# Altium footprint library SMT.PcbLib: 325 footprints (part 8 of 21)
Each footprint in its own frame and in the unit in brackets; x right, y up, seen from the top. Pads: shape width x height; smd on the part's side, far side on the other; paste and mask are expansions set on the pad; w line width, h text height; cw(c..) or ccw(c..) is an arc to the next point about the centre after c.
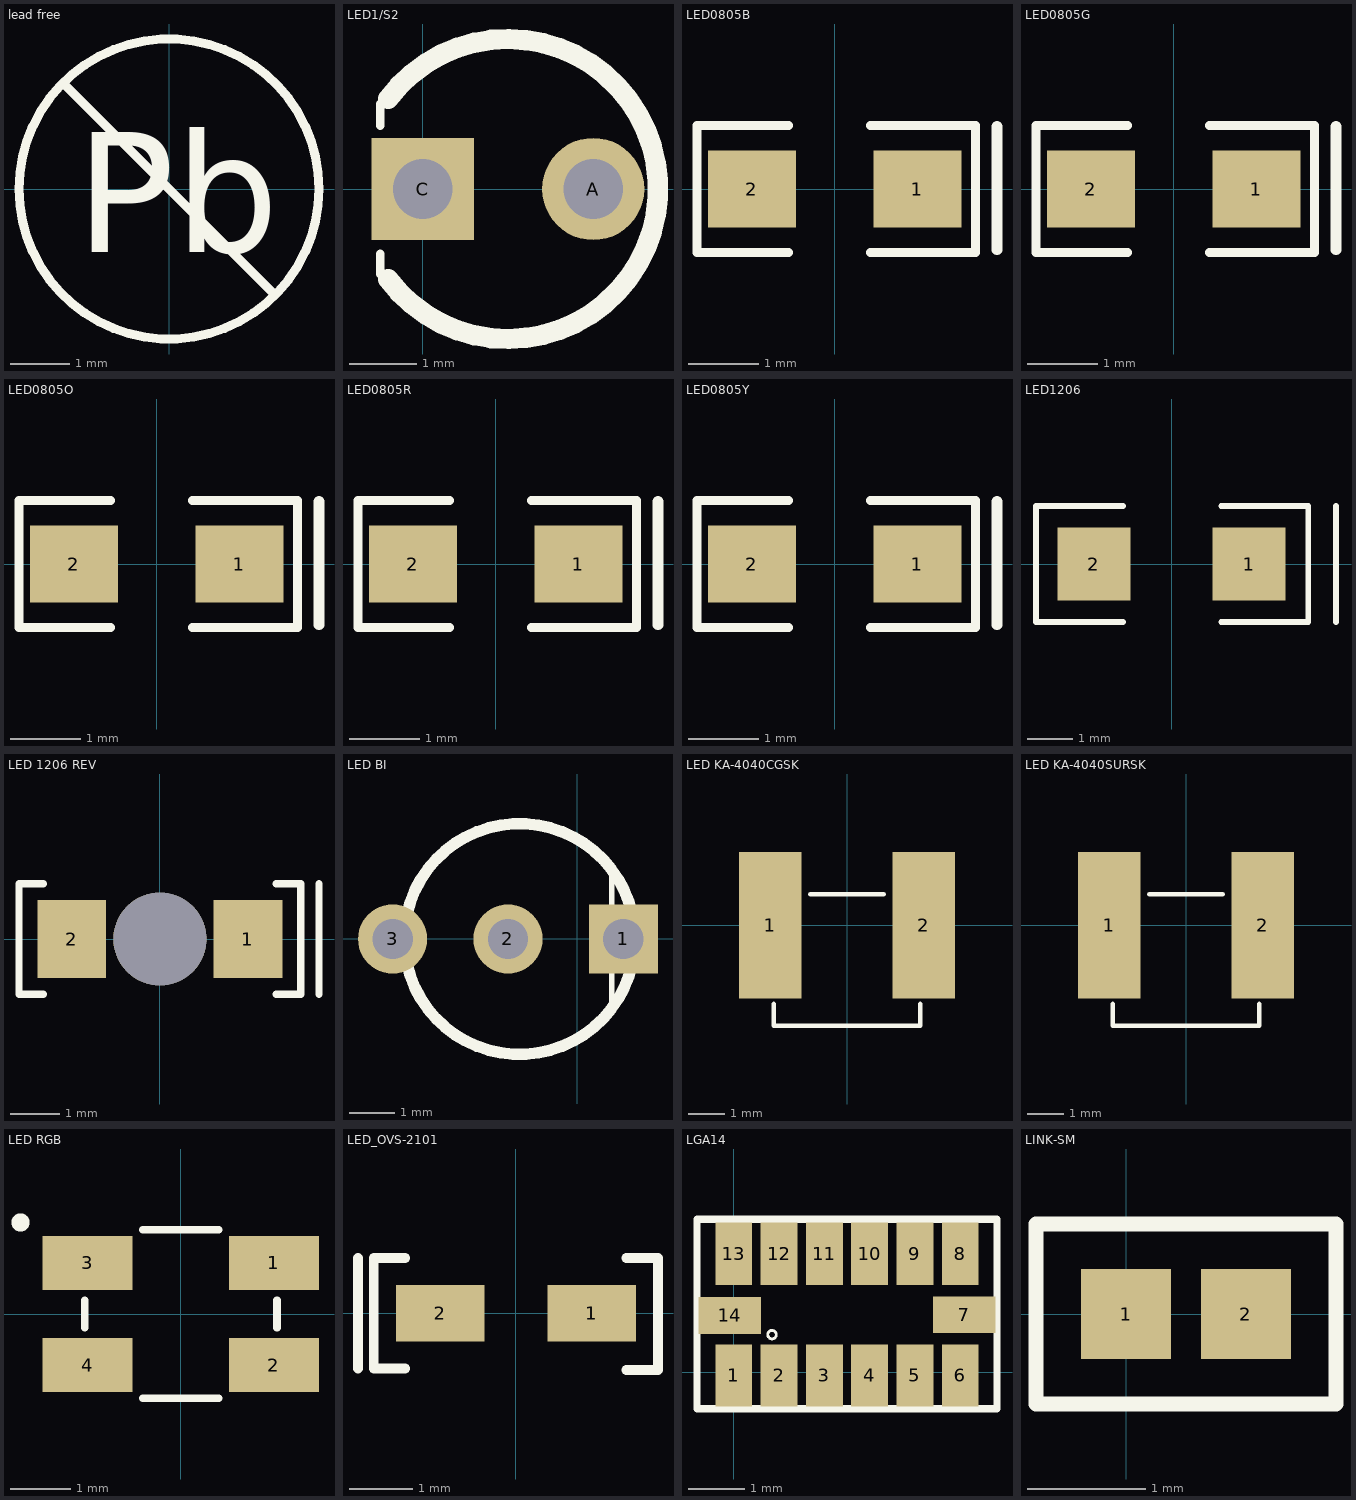
[diagram p7: the footprints below, top view; thin cyan lines are the x and y axes]

## lead free [mm]
TopOverlay:
  circle w0.152: c0,0 r2.54
  lines w0.152: -1.75,1.75 1.75,-1.75
  text "Pb" at -1.575,-1.075 h2.03

## LED1/S2 [mil]
pads (2):
  round 60 hole 35: A(100,0)
  rect 60x60 hole 35: C(0,0)
TopOverlay:
  lines w5: -25,-50 -25,-38 ; -25,37 -25,50
  lines w12: -20.28,-52.96 ccw(c50,0) -20.28,52.96

## LED0805B [mm] "LED SMT"
height 0.3
pads (2):
  rect 1.25x1.1 smd: 1(1.175,0) 2(-1.175,0)
TopOverlay:
  lines w0.127: -0.655,-0.9 -1.955,-0.9 -1.955,0.9 -0.655,0.9 ; 0.505,-0.9 2,-0.9 2,0.9 0.505,0.9
  lines w0.152: 2.305,-0.864 2.305,0.886
3D body: height 0.3, standoff 0, extent -1,-0.625 1,0.625
3D body: height 0.4, standoff 0, extent -0.397,-0.399 0.4,0.399

## LED0805G [mm] "LED SMT"
height 0.3
pads (2):
  rect 1.25x1.1 smd: 1(1.175,0) 2(-1.175,0)
TopOverlay:
  lines w0.127: -0.655,-0.9 -1.955,-0.9 -1.955,0.9 -0.655,0.9 ; 0.505,-0.9 2,-0.9 2,0.9 0.505,0.9
  lines w0.152: 2.305,-0.864 2.305,0.886
3D body: height 0.3, standoff 0, extent -1,-0.625 1,0.625
3D body: height 0.4, standoff 0, extent -0.397,-0.399 0.4,0.399

## LED0805O [mm] "LED SMT"
height 0.3
pads (2):
  rect 1.25x1.1 smd: 1(1.175,0) 2(-1.175,0)
TopOverlay:
  lines w0.127: -0.655,-0.9 -1.955,-0.9 -1.955,0.9 -0.655,0.9 ; 0.505,-0.9 2,-0.9 2,0.9 0.505,0.9
  lines w0.152: 2.305,-0.864 2.305,0.886
3D body: height 0.4, standoff 0, extent -0.397,-0.399 0.4,0.399
3D body: height 0.3, standoff 0, extent -1,-0.625 1,0.625

## LED0805R [mm] "LED SMT"
height 0.3
pads (2):
  rect 1.25x1.1 smd: 1(1.175,0) 2(-1.175,0)
TopOverlay:
  lines w0.127: -0.655,-0.9 -1.955,-0.9 -1.955,0.9 -0.655,0.9 ; 0.505,-0.9 2,-0.9 2,0.9 0.505,0.9
  lines w0.152: 2.305,-0.864 2.305,0.886
3D body: height 0.4, standoff 0, extent -0.397,-0.399 0.4,0.399
3D body: height 0.3, standoff 0, extent -1,-0.625 1,0.625

## LED0805Y [mm] "LED SMT"
height 0.3
pads (2):
  rect 1.25x1.1 smd: 1(1.175,0) 2(-1.175,0)
TopOverlay:
  lines w0.127: -0.655,-0.9 -1.955,-0.9 -1.955,0.9 -0.655,0.9 ; 0.505,-0.9 2,-0.9 2,0.9 0.505,0.9
  lines w0.152: 2.305,-0.864 2.305,0.886
3D body: height 0.3, standoff 0, extent -1,-0.625 1,0.625
3D body: height 0.4, standoff 0, extent -0.397,-0.399 0.4,0.399

## LED1206 [mil]
pads (2):
  rect 63x63 smd: 1(67,0) 2(-67,0)
TopOverlay:
  lines w5: -42,-50 -117,-50 -117,50 -42,50 ; 43,-50 118,-50 118,50 43,50 ; 142,-50 142,50

## LED 1206 REV [mm] "1.10mm Height 1206 Reverse Package"
pads (3):
  rect 1.4x1.6 smd: 1(1.8,0) 2(-1.8,0)
  round 1.9 hole 1.9 unplated: ""(0,0)
TopOverlay:
  lines w0.152: -2.375,-1.125 -2.875,-1.125 -2.875,1.125 -2.375,1.125 ; 2.375,-1.125 2.875,-1.125 2.875,1.125 2.375,1.125 ; 3.25,-1.125 3.25,1.125

## LED BI [mil]
pads (3):
  rect 60x60 hole 35: 1(40,0)
  round 60 hole 35: 2(-60,0) 3(-160,0)
TopOverlay:
  circle w10: c-50,0 r100
  lines w5: 30,-60 30,60

## LED KA-4040CGSK [mm] "KA-4040CGSK GREEN"
height 4
pads (2):
  rect 1.7x4 smd: 1(-2.1,0) 2(2.1,0)
TopOverlay:
  lines w0.127: -2,-2.15 -2,-2.75 0,-2.75 2,-2.75 2,-2.15 ; -1,0.85 0,0.85 1,0.85
3D body: height 4, standoff 0, extent -2,-2.75 2,0.85
3D body: height 3.8, standoff 1.4, extent -1.195,-2.85 1.195,-2.75

## LED KA-4040SURSK [mm] "KA-4040SURSK RED"
height 4
pads (2):
  rect 1.7x4 smd: 1(-2.1,0) 2(2.1,0)
TopOverlay:
  lines w0.127: -2,-2.15 -2,-2.75 0,-2.75 2,-2.75 2,-2.15 ; -1,0.85 0,0.85 1,0.85
3D body: height 3.8, standoff 1.4, extent -1.19,-2.85 1.2,-2.75
3D body: height 4, standoff 0, extent -2,-2.75 2,0.85

## LED RGB [mm] "WL-  SFTW  SMD  TOP  LED  full-  color waterclear"
height 1.9
pads (4):
  rect 1.5x0.9 smd: 1(1.55,0.85) 2(1.55,-0.85) 3(-1.55,0.85) 4(-1.55,-0.85)
TopOverlay:
  circle w0.254: c-2.667,1.524 r0.025
  lines w0.127: -1.6,-0.228 -1.6,0 -1.6,0.228 ; -0.632,-1.4 0,-1.4 0.632,-1.4 ; -0.632,1.4 0,1.4 0.632,1.4 ; 1.6,-0.228 1.6,0 1.6,0.228
3D body: height 1.9, standoff 0, extent -1.603,-1.4 1.6,1.422

## LED_OVS-2101 [mm]
pads (2):
  rect 1.4x0.9 smd: 1(1.2,0) 2(-1.2,0)
TopOverlay:
  lines w0.152: -2.5,-0.875 -2.5,0.875 ; -1.75,-0.875 -2.25,-0.875 -2.25,0.875 -1.75,0.875 ; 1.75,-0.9 2.25,-0.9 2.25,0.875 1.75,0.875
3D body: height 0.75, standoff 0.25, extent -0.25,0.304 0.25,0.796
3D body: height 0.8, standoff 0.1, extent -1.15,-0.475 1.15,0.775
3D body: height 0.2, standoff 0, extent -1.4,-0.325 -0.575,0.325
3D body: height 0.5, standoff 0.2, extent -1.4,-0.325 -1.15,0.325
3D body: height 0.5, standoff 0.2, extent 1.15,-0.325 1.4,0.325
3D body: height 0.2, standoff 0, extent 0.575,-0.325 1.4,0.325

## LGA14 [mm]
pads (14):
  rect 0.65x1.1 smd: 1(0,-0.06) 2(0.8,-0.06) 3(1.6,-0.06) 4(2.4,-0.06) 5(3.2,-0.06) 6(4,-0.06) 8(4,2.09) 9(3.2,2.09) 10(2.4,2.09) 11(1.6,2.09) 12(0.8,2.09) 13(0,2.09)
  rect 1.1x0.65 smd: 7(4.07,1.01) 14(-0.07,1)
TopOverlay:
  circle w0.05: c0.675,0.66 r0.075
  lines w0.127: -0.65,-0.65 4.65,-0.65 4.65,2.7 -0.65,2.7 -0.65,-0.65

## LINK-SM [mil]
pads (2):
  rect 30x30 smd: 1(0,0) 2(40,0)
TopOverlay:
  lines w5: -30,-30 -30,30 70,30 70,-30 -30,-30